# Altium footprint library FOOTPRINT.PcbLib: 132 footprints (part 5 of 9)
Each footprint in its own frame and in the unit in brackets; x right, y up, seen from the top. Pads: shape width x height; smd on the part's side, far side on the other; paste and mask are expansions set on the pad; w line width, h text height; cw(c..) or ccw(c..) is an arc to the next point about the centre after c.
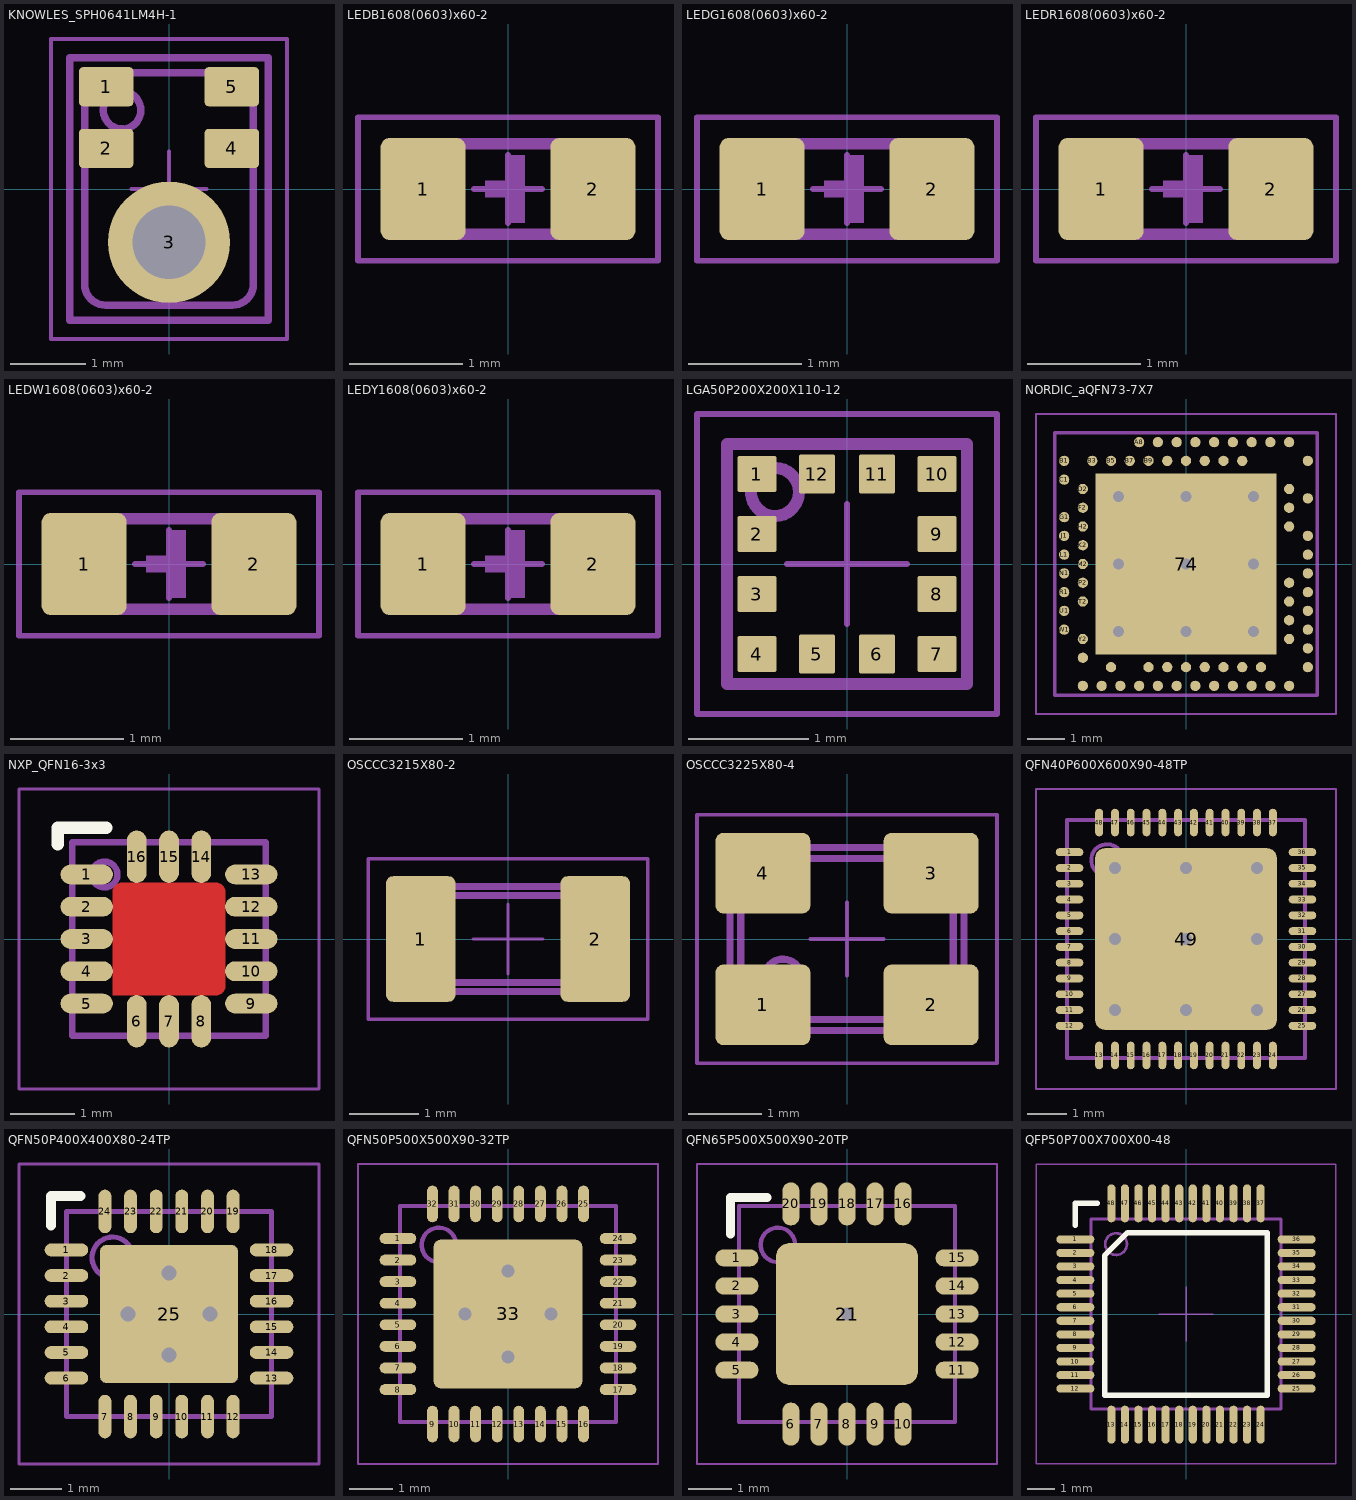
[diagram p4: the footprints below, top view; thin cyan lines are the x and y axes]

## KNOWLES_SPH0641LM4H-1 [mm] "Acoustic MEMS Microphone, 5-Pin, Body 3.5x2.65mm"
height 0.98
pads (5):
  rrect20% 0.725x0.522 smd paste-0.064: 1(-0.837,1.364) 2(-0.837,0.542) 4(0.837,0.542) 5(0.837,1.364)
  round 1.625 hole 0.975 paste-10: 3(0,-0.71)
Top Paste:
  region: -0.37,-1.236 -0.445,-1.311 -0.454,-1.32 -0.462,-1.343 -0.46,-1.368 -0.447,-1.389 -0.436,-1.396 -0.339,-1.457 -0.118,-1.522 0.112,-1.523 0.333,-1.46 0.431,-1.399 0.442,-1.392 0.457,-1.369 0.46,-1.342 0.451,-1.316 0.441,-1.307 0.371,-1.237 0.36,-1.226 0.332,-1.212 0.302,-1.207 0.271,-1.212 0.257,-1.22 0.195,-1.245 0.065,-1.275 -0.069,-1.274 -0.199,-1.244 -0.261,-1.218 -0.275,-1.211 -0.304,-1.207 -0.333,-1.212 -0.36,-1.225
  region: -0.526,-0.34 -0.601,-0.265 -0.61,-0.256 -0.633,-0.248 -0.658,-0.25 -0.679,-0.263 -0.686,-0.274 -0.747,-0.371 -0.812,-0.592 -0.813,-0.822 -0.75,-1.043 -0.689,-1.141 -0.682,-1.152 -0.659,-1.167 -0.632,-1.17 -0.606,-1.161 -0.597,-1.151 -0.527,-1.081 -0.516,-1.07 -0.502,-1.042 -0.497,-1.012 -0.502,-0.981 -0.51,-0.967 -0.535,-0.905 -0.565,-0.775 -0.564,-0.641 -0.534,-0.511 -0.508,-0.449 -0.501,-0.435 -0.497,-0.406 -0.502,-0.377 -0.515,-0.35
  region: 0.37,-0.184 0.445,-0.109 0.454,-0.1 0.462,-0.077 0.46,-0.052 0.447,-0.031 0.436,-0.024 0.339,0.037 0.118,0.102 -0.112,0.103 -0.333,0.04 -0.431,-0.021 -0.442,-0.028 -0.457,-0.051 -0.46,-0.078 -0.451,-0.104 -0.441,-0.113 -0.371,-0.183 -0.36,-0.194 -0.332,-0.208 -0.302,-0.213 -0.271,-0.208 -0.257,-0.2 -0.195,-0.175 -0.065,-0.145 0.069,-0.146 0.199,-0.176 0.261,-0.202 0.275,-0.209 0.304,-0.213 0.333,-0.208 0.36,-0.195
  region: 0.526,-1.08 0.601,-1.155 0.61,-1.164 0.633,-1.172 0.658,-1.17 0.679,-1.157 0.686,-1.146 0.747,-1.049 0.812,-0.828 0.813,-0.598 0.75,-0.377 0.689,-0.279 0.682,-0.268 0.659,-0.253 0.632,-0.25 0.606,-0.259 0.597,-0.269 0.527,-0.339 0.516,-0.35 0.502,-0.378 0.497,-0.408 0.502,-0.439 0.51,-0.453 0.535,-0.515 0.565,-0.645 0.564,-0.779 0.534,-0.909 0.508,-0.971 0.501,-0.985 0.497,-1.014 0.502,-1.043 0.515,-1.07
Top Assembly:
  circle w0.1: c-0.625,1.05 r0.25
  lines w0.1: -1.325,-1.75 1.325,-1.75 1.325,1.75 -1.325,1.75 -1.325,-1.75 ; -1.125,-1.271 ccw(c-0.846,-1.271) -0.846,-1.55 0.846,-1.55 ccw(c0.846,-1.271) 1.125,-1.271 1.125,1.271 ccw(c0.846,1.271) 0.846,1.55 -0.846,1.55 ccw(c-0.846,1.271) -1.125,1.271 -1.125,-1.271
Top Courtyard:
  lines w0.05: -1.575,-2 -1.325,-2 1.575,-2 1.575,2 -1.575,2 -1.575,-2
Top Component Center:
  lines w0.05: -0.5,0 0.5,0 ; 0,-0.5 0,0.5
Top Designator:
  text "'.Comment'" at 0.357,-1.475 h0.65
  text "'.Designator'" at -0.404,-1.475 h0.65
3D body "KNOWLES_SPH0641LM4H-1.x_t": height 0.99, standoff 0.01, extent -1.325,-1.75 1.325,1.75

## LEDB1608(0603)x60-2 [mm] "Led Blue, 2-Leads, Body 1.60x0.80mm"
height 0.6
pads (2):
  rrect20% 0.75x0.9 smd: 1(-0.75,0) 2(0.75,0)
Top Assembly:
  region: -0.2,0.075 -0.2,-0.075 0,-0.075 0,-0.3 0.15,-0.3 0.15,0.3 0,0.3 0,0.075
  lines w0.1: 0.8,-0.4 -0.8,-0.4 -0.8,0.4 0.8,0.4 ; 0.802,-0.4 0.802,0.4
  text "A" at 0.25,-0.207 h0.65
  text "C" at -0.65,-0.207 h0.65
Top Courtyard:
  lines w0.05: -1.325,-0.635 -1.325,0.635 1.325,0.635 1.325,-0.635 -1.325,-0.635
Top Component Center:
  lines w0.05: -0.3,0 0.3,0 ; 0,-0.3 0,0.3
Top Designator:
  text "'.Designator'" at 0.975,0.026 h0.65
  text "'.Comment'" at 0.975,-0.507 h0.65
3D body "User Library-LED_0603_B.x_t": height 0.6, standoff 0, extent -0.8,-0.4 0.8,0.4

## LEDG1608(0603)x60-2 [mm] "Led Green, 2-Leads, Body 1.60x0.80mm"
height 0.6
pads (2):
  rrect20% 0.75x0.9 smd: 1(-0.75,0) 2(0.75,0)
Top Assembly:
  region: -0.2,0.075 -0.2,-0.075 0,-0.075 0,-0.3 0.15,-0.3 0.15,0.3 0,0.3 0,0.075
  lines w0.1: 0.8,-0.4 -0.8,-0.4 -0.8,0.4 0.8,0.4 ; 0.802,-0.4 0.802,0.4
  text "A" at 0.25,-0.207 h0.65
  text "C" at -0.65,-0.207 h0.65
Top Courtyard:
  lines w0.05: -1.325,-0.635 1.325,-0.635 1.325,0.635 -1.325,0.635 -1.325,-0.635
Top Component Center:
  lines w0.05: -0.3,0 0.3,0 ; 0,-0.3 0,0.3
Top Designator:
  text "'.Designator'" at 0.975,0.026 h0.65
  text "'.Comment'" at 0.975,-0.507 h0.65
3D body "User Library-LED_0603_G.x_t": height 0.6, standoff 0, extent -0.8,-0.4 0.8,0.4

## LEDR1608(0603)x60-2 [mm] "Led Red, 2-Leads, Body 1.60x0.80mm"
height 0.6
pads (2):
  rrect20% 0.75x0.9 smd: 1(-0.75,0) 2(0.75,0)
Top Assembly:
  region: -0.2,0.075 -0.2,-0.075 0,-0.075 0,-0.3 0.15,-0.3 0.15,0.3 0,0.3 0,0.075
  lines w0.1: 0.8,-0.4 -0.8,-0.4 -0.8,0.4 0.8,0.4 ; 0.802,-0.4 0.802,0.4
  text "C" at -0.65,-0.207 h0.65
  text "A" at 0.25,-0.207 h0.65
Top Courtyard:
  lines w0.05: -1.325,-0.635 1.325,-0.635 1.325,0.635 -1.325,0.635 -1.325,-0.635
Top Component Center:
  lines w0.05: -0.3,0 0.3,0 ; 0,-0.3 0,0.3
Top Designator:
  text "'.Designator'" at 0.975,0.026 h0.65
  text "'.Comment'" at 0.975,-0.507 h0.65
3D body "User Library-LED_0603_R.x_t": height 0.6, standoff 0, extent -0.8,-0.4 0.8,0.4

## LEDW1608(0603)x60-2 [mm] "Led White, 2-Leads, Body 1.60x0.80mm"
height 0.6
pads (2):
  rrect20% 0.75x0.9 smd: 1(-0.75,0) 2(0.75,0)
Top Assembly:
  region: -0.2,0.075 -0.2,-0.075 0,-0.075 0,-0.3 0.15,-0.3 0.15,0.3 0,0.3 0,0.075
  lines w0.1: 0.8,-0.4 -0.8,-0.4 -0.8,0.4 0.8,0.4 ; 0.802,-0.4 0.802,0.4
  text "A" at 0.25,-0.207 h0.65
  text "C" at -0.65,-0.207 h0.65
Top Courtyard:
  lines w0.05: -1.325,-0.635 -1.325,0.635 1.325,0.635 1.325,-0.635 -1.325,-0.635
Top Component Center:
  lines w0.05: -0.3,0 0.3,0 ; 0,-0.3 0,0.3
Top Designator:
  text "'.Comment'" at 0.975,-0.507 h0.65
  text "'.Designator'" at 0.975,0.026 h0.65
3D body "User Library-LED_0603_W.x_t": height 0.6, standoff 0, extent -0.8,-0.4 0.8,0.4

## LEDY1608(0603)x60-2 [mm] "Led Yellow, 2-Leads, Body 1.60x0.80mm"
height 0.6
pads (2):
  rrect20% 0.75x0.9 smd: 1(-0.75,0) 2(0.75,0)
Top Assembly:
  region: -0.2,0.075 -0.2,-0.075 0,-0.075 0,-0.3 0.15,-0.3 0.15,0.3 0,0.3 0,0.075
  lines w0.1: 0.8,-0.4 -0.8,-0.4 -0.8,0.4 0.8,0.4 ; 0.802,-0.4 0.802,0.4
  text "C" at -0.65,-0.207 h0.65
  text "A" at 0.25,-0.207 h0.65
Top Courtyard:
  lines w0.05: -1.325,-0.635 1.325,-0.635 1.325,0.635 -1.325,0.635 -1.325,-0.635
Top Component Center:
  lines w0.05: -0.3,0 0.3,0 ; 0,-0.3 0,0.3
Top Designator:
  text "'.Designator'" at 0.975,0.026 h0.65
  text "'.Comment'" at 0.975,-0.507 h0.65
3D body "User Library-LED_0603_Y.x_t": height 0.6, standoff 0, extent -0.8,-0.4 0.8,0.4

## LGA50P200X200X110-12 [mm] "LGA12, 12-Leads, Body 2.00x2.00mm"
height 1.1
pads (12):
  rrect10% 0.325x0.3 smd paste-0.008: 1(-0.75,0.75) 2(-0.75,0.25) 3(-0.75,-0.25) 4(-0.75,-0.75) 7(0.75,-0.75) 8(0.75,-0.25) 9(0.75,0.25) 10(0.75,0.75)
  rrect10% 0.3x0.325 smd paste-0.008: 5(-0.25,-0.75) 6(0.25,-0.75) 11(0.25,0.75) 12(-0.25,0.75)
Top Assembly:
  circle w0.1: c-0.6,0.6 r0.2
  lines w0.1: -1,-1 -1,1 1,1 1,-1 -1,-1
Top Courtyard:
  lines w0.05: -1.25,-1.25 1.25,-1.25 1.25,1.25 -1.25,1.25 -1.25,-1.25
Top Component Center:
  lines w0.05: -0.5,0 0.5,0 ; 0,-0.5 0,0.5
Top Designator:
  text "'.Designator'" at -1.25,-1.496 h0.65
  text "'.Comment'" at -1.25,-1.982 h0.65
3D body: height 1.1, standoff 0, extent -1,-1 1,1
3D body: height 1.1, standoff 0, extent -0.75,0.3 -0.3,0.75

## NORDIC_aQFN73-7X7 [mm] "QFN73, 73-Leads, Thermal Pad, Body 7.00x7.00mm"
pads (74):
  rect 4.83x4.83 smd paste-100 mask+0.05: 74(0,0)
  round 0.275 smd paste-0.01 mask+0.05: A8(-1.25,3.25) A10(-0.75,3.25) A12(-0.25,3.25) A14(0.25,3.25) A16(0.75,3.25) A18(1.25,3.25) A20(1.75,3.25) A22(2.25,3.25) A23(2.75,3.25) AA24(3.25,-2.25) AB2(-2.75,-2.5) AC5(-2,-2.75) AC9(-1,-2.75) AC11(-0.5,-2.75) AC13(0,-2.75) AC15(0.5,-2.75) AC17(1,-2.75) AC19(1.5,-2.75) AC21(2,-2.75) AC24(3.25,-2.75) AD2(-2.75,-3.25) AD4(-2.25,-3.25) AD6(-1.75,-3.25) AD8(-1.25,-3.25) AD10(-0.75,-3.25) AD12(-0.25,-3.25) AD14(0.25,-3.25) AD16(0.75,-3.25) AD18(1.25,-3.25) AD20(1.75,-3.25) AD22(2.25,-3.25) AD23(2.75,-3.25) B1(-3.25,2.75) B3(-2.5,2.75) B5(-2,2.75) B7(-1.5,2.75) B9(-1,2.75) B11(-0.5,2.75) B13(0,2.75) B15(0.5,2.75) B17(1,2.75) B19(1.5,2.75) B24(3.25,2.75) C1(-3.25,2.25) D2(-2.75,2) D23(2.75,2) E24(3.25,1.75) F2(-2.75,1.5) F23(2.75,1.5) G1(-3.25,1.25) H2(-2.75,1) H23(2.75,1) J1(-3.25,0.75) J24(3.25,0.75) K2(-2.75,0.5) L1(-3.25,0.25) L24(3.25,0.25) M2(-2.75,0) N1(-3.25,-0.25) N24(3.25,-0.25) P2(-2.75,-0.5) P23(2.75,-0.5) R1(-3.25,-0.75) R24(3.25,-0.75) T2(-2.75,-1) T23(2.75,-1) U1(-3.25,-1.25) U24(3.25,-1.25) V23(2.75,-1.5) W1(-3.25,-1.75) W24(3.25,-1.75) Y2(-2.75,-2) Y23(2.75,-2)
via -1.8,0 diameter 0.6 hole 0.3
via -1.8,-1.8 diameter 0.6 hole 0.3
via 1.8,-1.8 diameter 0.6 hole 0.3
via -1.8,1.8 diameter 0.6 hole 0.3
via 1.8,1.8 diameter 0.6 hole 0.3
via 1.8,0 diameter 0.6 hole 0.3
via 0,1.8 diameter 0.6 hole 0.3
via 0,-1.8 diameter 0.6 hole 0.3
via 0,0 diameter 0.6 hole 0.3
Top Paste:
  drawing of 16 lines, arcs and shapes, not listed
Top Assembly:
  lines w0.1: -3.5,-3.5 -3.5,3.5 3.5,3.5 3.5,-3.5 -3.5,-3.5
Top Courtyard:
  lines w0.05: -4,-4 4,-4 4,4 -4,4 -4,-4
Top Component Center:
  lines w0.05: -1,0 1,0 ; 0,-1 0,1
Top Designator:
  text "'.Designator'" at -1.75,0.426 h0.65
  text "'.Comment'" at -1.75,-0.735 h0.65
3D body: height 0.85, standoff 0, extent -3.5,-3.5 3.5,3.5
3D body: height 0.05, standoff 0, extent -3.1,2.7 -2.7,3.1
3D body: height 0.84, standoff 0.05, extent -3.1,2.7 -2.7,3.1

## NXP_QFN16-3x3 [mm] "QFN16, 16-Leads, Body 3.00x3.00mm"
height 1
pads (16):
  oval 0.813x0.305 smd paste+0: 1(-1.275,1) 2(-1.275,0.5) 3(-1.275,0) 4(-1.275,-0.5) 5(-1.275,-1) 9(1.275,-1) 10(1.275,-0.5) 11(1.275,0) 12(1.275,0.5) 13(1.275,1)
  oval 0.305x0.813 smd paste+0: 6(-0.5,-1.275) 7(0,-1.275) 8(0.5,-1.275) 14(0.5,1.275) 15(0,1.275) 16(-0.5,1.275)
Top:
  pour cut-out: -0.875,-0.875 -0.875,0.725 -0.875,0.755 -0.852,0.81 -0.81,0.852 -0.755,0.875 -0.725,0.875 0.725,0.875 0.755,0.875 0.81,0.852 0.852,0.81 0.875,0.755 0.875,0.725 0.875,-0.725 0.875,-0.755 0.852,-0.81 0.81,-0.852 0.755,-0.875 0.725,-0.875
Top Overlay:
  lines w0.2: -1.725,1.475 -1.725,1.725 -0.975,1.725
Top Assembly:
  circle w0.1: c-1,1 r0.2
  lines w0.1: -1.5,-1.5 -1.5,1.5 1.5,1.5 1.5,-1.5 -1.5,-1.5
Top Courtyard:
  lines w0.05: -2.325,-2.325 2.325,-2.325 2.325,2.325 -2.325,2.325 -2.325,-2.325
Top Component Center:
  lines w0.05: -0.5,0 0.5,0 ; 0,-0.5 0,0.5
Top Designator:
  text "'.Designator'" at -1.425,0.254 h0.65
  text "'.Comment'" at -1.425,-0.557 h0.65
3D body "QFN_QFN50P300X300X100-16.x_t": height 1.01, standoff 0.01, extent -1.51,-1.51 1.51,1.51

## OSCCC3215X80-2 [mm] "Oscillator, Corner Concave, 2-Leads, Body 3.20x1.50mm"
height 0.8
pads (2):
  rrect20% 1x1.8 smd: 1(-1.25,0) 2(1.25,0)
Top Assembly:
  lines w0.1: 1.4,-0.75 -1.4,-0.75 ccw(c-1.6,-0.75) -1.6,-0.55 -1.6,0.55 ; 1.4,-0.75 cw(c1.6,-0.75) 1.6,-0.55 1.6,0.55 ; -1.6,0.55 ccw(c-1.6,0.75) -1.4,0.75 1.4,0.75 ccw(c1.6,0.75) 1.6,0.55 ; -1.6,0.55 -1.6,0.55 ; 1.6,0.55 1.6,0.55 ; -1.45,-0.325 ccw(c-1.15,-0.325) -1.15,-0.625 1.15,-0.625 ccw(c1.15,-0.325) 1.45,-0.325 1.45,0.325 ccw(c1.15,0.325) 1.15,0.625 -1.15,0.625 ccw(c-1.15,0.325) -1.45,0.325 -1.45,-0.325
Top Courtyard:
  lines w0.05: -2,-1.15 -2,1.15 2,1.15 2,-1.15 -2,-1.15
Top Component Center:
  lines w0.05: -0.5,0 0.5,0 ; 0,-0.5 0,0.5
Top Designator:
  text "'.Designator'" at -1.375,0.076 h0.65
  text "'.Comment'" at -1.375,-0.51 h0.65
3D body "OSCCC3215X80-2.x_t": height 0.81, standoff 0.01, extent -1.6,-0.75 1.6,0.75

## OSCCC3225X80-4 [mm] "Oscillator, Corner Concave, 4-Leads, Body 3.20x2.50mm"
height 0.8
pads (4):
  rrect20% 1.3x1.1 smd: 1(-1.15,-0.9) 2(1.15,-0.9) 3(1.15,0.9) 4(-1.15,0.9)
Top Assembly:
  circle w0.1: c-0.875,-0.525 r0.25
  lines w0.1: -1.6,-1.05 cw(c-1.6,-1.25) -1.4,-1.25 1.4,-1.25 cw(c1.6,-1.25) 1.6,-1.05 1.6,1.05 cw(c1.6,1.25) 1.4,1.25 -1.4,1.25 cw(c-1.6,1.25) -1.6,1.05 -1.6,-1.05 ; -1.45,-0.8 ccw(c-1.15,-0.8) -1.15,-1.1 1.15,-1.1 ccw(c1.15,-0.8) 1.45,-0.8 1.45,0.8 ccw(c1.15,0.8) 1.15,1.1 -1.15,1.1 ccw(c-1.15,0.8) -1.45,0.8 -1.45,-0.8
Top Courtyard:
  lines w0.05: -2.05,-1.7 2.05,-1.7 2.05,1.7 -2.05,1.7 -2.05,-1.7
Top Component Center:
  lines w0.05: -0.5,0 0.5,0 ; 0,-0.5 0,0.5
Top Designator:
  text "'.Designator'" at -1.375,0.076 h0.65
  text "'.Comment'" at -1.375,-0.51 h0.65
3D body "OSCCC3225X80.x_t": height 0.81, standoff 0.01, extent -1.6,-1.25 1.6,1.25

## QFN40P600X600X90-48TP [mm] "QFN48, 49-Leads, Thermal Pad, Body 6.00x6.00mm"
height 0.9
pads (49):
  oval 0.7x0.2 smd paste+0: 1(-2.95,2.2) 2(-2.95,1.8) 3(-2.95,1.4) 4(-2.95,1) 5(-2.95,0.6) 6(-2.95,0.2) 7(-2.95,-0.2) 8(-2.95,-0.6) 9(-2.95,-1) 10(-2.95,-1.4) 11(-2.95,-1.8) 12(-2.95,-2.2) 25(2.95,-2.2) 26(2.95,-1.8) 27(2.95,-1.4) 28(2.95,-1) 29(2.95,-0.6) 30(2.95,-0.2) 31(2.95,0.2) 32(2.95,0.6) 33(2.95,1) 34(2.95,1.4) 35(2.95,1.8) 36(2.95,2.2)
  oval 0.2x0.7 smd paste+0: 13(-2.2,-2.95) 14(-1.8,-2.95) 15(-1.4,-2.95) 16(-1,-2.95) 17(-0.6,-2.95) 18(-0.2,-2.95) 19(0.2,-2.95) 20(0.6,-2.95) 21(1,-2.95) 22(1.4,-2.95) 23(1.8,-2.95) 24(2.2,-2.95) 37(2.2,2.95) 38(1.8,2.95) 39(1.4,2.95) 40(1,2.95) 41(0.6,2.95) 42(0.2,2.95) 43(-0.2,2.95) 44(-0.6,2.95) 45(-1,2.95) 46(-1.4,2.95) 47(-1.8,2.95) 48(-2.2,2.95)
  rrect10% 4.6x4.6 smd paste-100: 49(0,0)
via 0,0 diameter 0.6 hole 0.3
via 0,-1.8 diameter 0.6 hole 0.3
via 0,1.8 diameter 0.6 hole 0.3
via 1.8,0 diameter 0.6 hole 0.3
via 1.8,1.8 diameter 0.6 hole 0.3
via -1.8,1.8 diameter 0.6 hole 0.3
via 1.8,-1.8 diameter 0.6 hole 0.3
via -1.8,-1.8 diameter 0.6 hole 0.3
via -1.8,0 diameter 0.6 hole 0.3
Top Paste:
  drawing of 14 lines, arcs and shapes, not listed
Top Assembly:
  circle w0.1: c-2,2 r0.4
  lines w0.1: -3.01,-3.01 -3.01,3.01 3.01,3.01 3.01,-3.01 -3.01,-3.01
Top Courtyard:
  lines w0.05: -3.8,-3.8 3.8,-3.8 3.8,3.8 -3.8,3.8 -3.8,-3.8
Top Component Center:
  lines w0.05: -1,0 1,0 ; 0,-1 0,1
Top Designator:
  text "'.Designator'" at -1.925,0.351 h0.65
  text "'.Comment'" at -1.925,-0.81 h0.65
3D body "QFN_QFN40P600X600X90-48P.x_t": height 0.91, standoff 0.01, extent -3.01,-3.01 3.01,3.01

## QFN50P400X400X80-24TP [mm] "QFN24, 25-Leads, Thermal Pad, Body 4.00x4.00mm"
height 0.9
pads (25):
  oval 0.85x0.25 smd paste-0.02: 1(-2,1.25) 2(-2,0.75) 3(-2,0.25) 4(-2,-0.25) 5(-2,-0.75) 6(-2,-1.25) 13(2,-1.25) 14(2,-0.75) 15(2,-0.25) 16(2,0.25) 17(2,0.75) 18(2,1.25)
  oval 0.25x0.85 smd paste-0.02: 7(-1.25,-2) 8(-0.75,-2) 9(-0.25,-2) 10(0.25,-2) 11(0.75,-2) 12(1.25,-2) 19(1.25,2) 20(0.75,2) 21(0.25,2) 22(-0.25,2) 23(-0.75,2) 24(-1.25,2)
  rrect10% 2.7x2.7 smd paste-100: 25(0,0)
via 0,0.8 diameter 0.6 hole 0.3
via -0.8,0 diameter 0.6 hole 0.3
via 0.8,0 diameter 0.6 hole 0.3
via 0,-0.8 diameter 0.6 hole 0.3
Top Overlay:
  lines w0.2: -2.3,1.725 -2.3,2.3 -1.725,2.3
Top Paste:
  region: 0.3,-0.8 0.3,-0.899 0.376,-1.083 0.517,-1.224 0.701,-1.3 0.8,-1.3 0.899,-1.3 1.083,-1.224 1.224,-1.083 1.3,-0.899 1.3,-0.8 1.3,-0.701 1.224,-0.517 1.083,-0.376 0.899,-0.3 0.8,-0.3 0.701,-0.3 0.517,-0.376 0.376,-0.517 0.3,-0.701
  region: -0.8,-0.3 -0.899,-0.3 -1.083,-0.376 -1.224,-0.517 -1.3,-0.701 -1.3,-0.8 -1.3,-0.899 -1.224,-1.083 -1.083,-1.224 -0.899,-1.3 -0.8,-1.3 -0.701,-1.3 -0.517,-1.224 -0.376,-1.083 -0.3,-0.899 -0.3,-0.8 -0.3,-0.701 -0.376,-0.517 -0.517,-0.376 -0.701,-0.3
  region: -0.3,0.8 -0.3,0.899 -0.376,1.083 -0.517,1.224 -0.701,1.3 -0.8,1.3 -0.899,1.3 -1.083,1.224 -1.224,1.083 -1.3,0.899 -1.3,0.8 -1.3,0.701 -1.224,0.517 -1.083,0.376 -0.899,0.3 -0.8,0.3 -0.701,0.3 -0.517,0.376 -0.376,0.517 -0.3,0.701
  region: 0.8,0.3 0.899,0.3 1.083,0.376 1.224,0.517 1.3,0.701 1.3,0.8 1.3,0.899 1.224,1.083 1.083,1.224 0.899,1.3 0.8,1.3 0.701,1.3 0.517,1.224 0.376,1.083 0.3,0.899 0.3,0.8 0.3,0.701 0.376,0.517 0.517,0.376 0.701,0.3
  region: 0,-0.5 0.099,-0.5 0.283,-0.424 0.424,-0.283 0.5,-0.099 0.5,0 0.5,0.099 0.424,0.283 0.283,0.424 0.099,0.5 0,0.5 -0.099,0.5 -0.283,0.424 -0.424,0.283 -0.5,0.099 -0.5,0 -0.5,-0.099 -0.424,-0.283 -0.283,-0.424 -0.099,-0.5
Top Assembly:
  circle w0.1: c-1.1,1.1 r0.4
  lines w0.1: -2,-2 2,-2 2,2 -2,2 -2,-2
Top Courtyard:
  lines w0.05: -2.925,-2.925 2.925,-2.925 2.925,2.925 -2.925,2.925 -2.925,-2.425 -2.925,-2.925
Top Component Center:
  lines w0.05: -1,0 1,0 ; 0,-1 0,1
Top Designator:
  text "'.Comment'" at -1.475,-0.81 h0.65
  text "'.Designator'" at -1.475,0.351 h0.65
3D body "QFN_QFN50P400X400X80-24TP.x_t": height 0.91, standoff 0.01, extent -2.01,-2.01 2.01,2.01

## QFN50P500X500X90-32TP [mm] "QFN48, 33-Leads, Thermal Pad, Body 5.00x5.00mm"
height 0.9
pads (33):
  oval 0.85x0.25 smd: 1(-2.55,1.75) 2(-2.55,1.25) 3(-2.55,0.75) 4(-2.55,0.25) 5(-2.55,-0.25) 6(-2.55,-0.75) 7(-2.55,-1.25) 8(-2.55,-1.75) 17(2.55,-1.75) 18(2.55,-1.25) 19(2.55,-0.75) 20(2.55,-0.25) 21(2.55,0.25) 22(2.55,0.75) 23(2.55,1.25) 24(2.55,1.75)
  oval 0.25x0.85 smd: 9(-1.75,-2.55) 10(-1.25,-2.55) 11(-0.75,-2.55) 12(-0.25,-2.55) 13(0.25,-2.55) 14(0.75,-2.55) 15(1.25,-2.55) 16(1.75,-2.55) 25(1.75,2.55) 26(1.25,2.55) 27(0.75,2.55) 28(0.25,2.55) 29(-0.25,2.55) 30(-0.75,2.55) 31(-1.25,2.55) 32(-1.75,2.55)
  rrect10% 3.45x3.45 smd paste-100: 33(0,0)
via -1,0 diameter 0.6 hole 0.3
via 0,-1 diameter 0.6 hole 0.3
via 1,0 diameter 0.6 hole 0.3
via 0,1 diameter 0.6 hole 0.3
Top Paste:
  region: 1.575,-1 1.575,-1.114 1.487,-1.326 1.326,-1.487 1.114,-1.575 1,-1.575 0.886,-1.575 0.674,-1.487 0.513,-1.326 0.425,-1.114 0.425,-1 0.425,-0.886 0.513,-0.674 0.674,-0.513 0.886,-0.425 1,-0.425 1.114,-0.425 1.326,-0.513 1.487,-0.674 1.575,-0.886
  region: 1,1.575 1.115,1.575 1.326,1.487 1.488,1.326 1.575,1.114 1.575,1 1.575,0.886 1.488,0.674 1.326,0.513 1.115,0.425 1,0.425 0.886,0.425 0.674,0.513 0.513,0.674 0.425,0.886 0.425,1 0.425,1.114 0.513,1.326 0.674,1.487 0.886,1.575
  region: -1.575,1 -1.575,1.115 -1.487,1.326 -1.326,1.488 -1.114,1.575 -1,1.575 -0.885,1.575 -0.674,1.488 -0.512,1.326 -0.425,1.115 -0.425,1 -0.425,0.886 -0.512,0.674 -0.674,0.513 -0.885,0.425 -1,0.425 -1.114,0.425 -1.326,0.513 -1.487,0.674 -1.575,0.886
  region: -1,-1.575 -1.114,-1.575 -1.326,-1.487 -1.487,-1.326 -1.575,-1.114 -1.575,-1 -1.575,-0.885 -1.487,-0.674 -1.326,-0.512 -1.114,-0.425 -1,-0.425 -0.886,-0.425 -0.674,-0.512 -0.513,-0.674 -0.425,-0.885 -0.425,-1 -0.425,-1.114 -0.513,-1.326 -0.674,-1.487 -0.886,-1.575
  region: 0.575,0 0.575,-0.114 0.487,-0.326 0.326,-0.487 0.114,-0.575 0,-0.575 -0.114,-0.575 -0.326,-0.487 -0.487,-0.326 -0.575,-0.114 -0.575,0 -0.575,0.114 -0.487,0.326 -0.326,0.487 -0.114,0.575 0,0.575 0.114,0.575 0.326,0.487 0.487,0.326 0.575,0.114
Top Assembly:
  circle w0.1: c-1.6,1.6 r0.4
  lines w0.1: -2.5,-2.5 2.5,-2.5 2.5,2.5 -2.5,2.5 -2.5,-2.5
Top Courtyard:
  lines w0.05: -3.475,-3.475 3.475,-3.475 3.475,3.475 -3.475,3.475 -3.475,-3.475
Top Component Center:
  lines w0.05: -1,0 1,0 ; 0,-1 0,1
Top Designator:
  text "'.Designator'" at -1.925,0.351 h0.65
  text "'.Comment'" at -1.925,-0.81 h0.65
3D body "QFN_QFN50P500X500X90-32TP.x_t": height 1.01, standoff 0.01, extent -2.51,-2.51 2.51,2.51

## QFN65P500X500X90-20TP [mm] "QFN20, 21-Leads, Thermal Pad, Body 5.00x5.00mm"
height 0.9
pads (21):
  oval 1x0.4 smd: 1(-2.55,1.3) 2(-2.55,0.65) 3(-2.55,0) 4(-2.55,-0.65) 5(-2.55,-1.3) 11(2.55,-1.3) 12(2.55,-0.65) 13(2.55,0) 14(2.55,0.65) 15(2.55,1.3)
  oval 0.4x1 smd: 6(-1.3,-2.55) 7(-0.65,-2.55) 8(0,-2.55) 9(0.65,-2.55) 10(1.3,-2.55) 16(1.3,2.55) 17(0.65,2.55) 18(0,2.55) 19(-0.65,2.55) 20(-1.3,2.55)
  rrect20% 3.3x3.3 smd paste-10: 21(0,0)
via 0,0 diameter 0.6 hole 0.3
Top Overlay:
  lines w0.2: -2.7,1.85 -2.7,2.7 -1.85,2.7
Top Paste:
  region: 0.625,-0.525 1.225,-0.525 1.245,-0.525 1.282,-0.54 1.31,-0.568 1.325,-0.605 1.325,-0.625 1.325,-1.225 1.325,-1.245 1.31,-1.282 1.282,-1.31 1.245,-1.325 1.225,-1.325 0.625,-1.325 0.605,-1.325 0.568,-1.31 0.54,-1.282 0.525,-1.245 0.525,-1.225 0.525,-0.625 0.525,-0.605 0.54,-0.568 0.568,-0.54 0.605,-0.525
  region: 0.525,0.625 0.525,1.225 0.525,1.245 0.54,1.282 0.568,1.31 0.605,1.325 0.625,1.325 1.225,1.325 1.245,1.325 1.282,1.31 1.31,1.282 1.325,1.245 1.325,1.225 1.325,0.625 1.325,0.605 1.31,0.568 1.282,0.54 1.245,0.525 1.225,0.525 0.625,0.525 0.605,0.525 0.568,0.54 0.54,0.568 0.525,0.605
  region: -0.625,0.525 -1.225,0.525 -1.245,0.525 -1.282,0.54 -1.31,0.568 -1.325,0.605 -1.325,0.625 -1.325,1.225 -1.325,1.245 -1.31,1.282 -1.282,1.31 -1.245,1.325 -1.225,1.325 -0.625,1.325 -0.605,1.325 -0.568,1.31 -0.54,1.282 -0.525,1.245 -0.525,1.225 -0.525,0.625 -0.525,0.605 -0.54,0.568 -0.568,0.54 -0.605,0.525
  region: -0.525,-0.625 -0.525,-1.225 -0.525,-1.245 -0.54,-1.282 -0.568,-1.31 -0.605,-1.325 -0.625,-1.325 -1.225,-1.325 -1.245,-1.325 -1.282,-1.31 -1.31,-1.282 -1.325,-1.245 -1.325,-1.225 -1.325,-0.625 -1.325,-0.605 -1.31,-0.568 -1.282,-0.54 -1.245,-0.525 -1.225,-0.525 -0.625,-0.525 -0.605,-0.525 -0.568,-0.54 -0.54,-0.568 -0.525,-0.605
Top Assembly:
  circle w0.1: c-1.6,1.6 r0.4
  lines w0.1: -2.5,-2.5 2.5,-2.5 2.5,2.5 -2.5,2.5 -2.5,-2.5
Top Courtyard:
  lines w0.05: -3.475,-3.475 -3.475,3.475 3.475,3.475 3.475,-3.475 -3.475,-3.475
Top Component Center:
  lines w0.05: -0.5,0 0.5,0 ; 0,-0.5 0,0.5
Top Designator:
  text "'.Comment'" at -1.825,-0.81 h0.65
  text "'.Designator'" at -1.825,0.351 h0.65
3D body "QFN_QFN65P500X500X90-20TP.x_t": height 0.91, standoff 0.01, extent -2.51,-2.51 2.51,2.51

## QFP50P700X700X00-48 [mm] "QFP48, 48-Leads, Body 7.00x7.00mm"
height 1
pads (48):
  oval 1.4x0.3 smd paste-0.025: 1(-4.075,2.75) 2(-4.075,2.25) 3(-4.075,1.75) 4(-4.075,1.25) 5(-4.075,0.75) 6(-4.075,0.25) 7(-4.075,-0.25) 8(-4.075,-0.75) 9(-4.075,-1.25) 10(-4.075,-1.75) 11(-4.075,-2.25) 12(-4.075,-2.75) 25(4.075,-2.75) 26(4.075,-2.25) 27(4.075,-1.75) 28(4.075,-1.25) 29(4.075,-0.75) 30(4.075,-0.25) 31(4.075,0.25) 32(4.075,0.75) 33(4.075,1.25) 34(4.075,1.75) 35(4.075,2.25) 36(4.075,2.75)
  oval 0.3x1.4 smd paste-0.025: 13(-2.75,-4.075) 14(-2.25,-4.075) 15(-1.75,-4.075) 16(-1.25,-4.075) 17(-0.75,-4.075) 18(-0.25,-4.075) 19(0.25,-4.075) 20(0.75,-4.075) 21(1.25,-4.075) 22(1.75,-4.075) 23(2.25,-4.075) 24(2.75,-4.075) 37(2.75,4.075) 38(2.25,4.075) 39(1.75,4.075) 40(1.25,4.075) 41(0.75,4.075) 42(0.25,4.075) 43(-0.25,4.075) 44(-0.75,4.075) 45(-1.25,4.075) 46(-1.75,4.075) 47(-2.25,4.075) 48(-2.75,4.075)
Top Overlay:
  lines w0.2: -4.075,3.275 -4.075,4.075 -3.275,4.075 ; -3,-3 -3,2.15 -2.15,3 3,3 3,-3 -3,-3
Top Assembly:
  circle w0.1: c-2.575,2.575 r0.4
  lines w0.1: -4.5,-2.75 -3.5,-2.75 ; -4.5,-2.25 -3.5,-2.25 ; -4.5,-1.75 -3.5,-1.75 ; -4.5,-1.25 -3.5,-1.25 ; -4.5,-0.75 -3.5,-0.75 ; -4.5,-0.25 -3.5,-0.25 ; -4.5,0.25 -3.5,0.25 ; -4.5,0.75 -3.5,0.75 ; -4.5,1.25 -3.5,1.25 ; -4.5,1.75 -3.5,1.75 ; -4.5,2.25 -3.5,2.25 ; -4.5,2.75 -3.5,2.75 ; -2.75,-4.5 -2.75,-3.5 ; -2.75,3.5 -2.75,4.5 ; -2.25,-4.5 -2.25,-3.5 ; -2.25,3.5 -2.25,4.5 ; -1.75,-4.5 -1.75,-3.5 ; -1.75,3.5 -1.75,4.5 ; -1.25,-4.5 -1.25,-3.5 ; -1.25,3.5 -1.25,4.5 ; -0.75,-4.5 -0.75,-3.5 ; -0.75,3.5 -0.75,4.5 ; -0.25,-4.5 -0.25,-3.5 ; -0.25,3.5 -0.25,4.5 ; 0.25,-4.5 0.25,-3.5 ; 0.25,3.5 0.25,4.5 ; 0.75,-4.5 0.75,-3.5 ; 0.75,3.5 0.75,4.5 ; 1.25,-4.5 1.25,-3.5 ; 1.25,3.5 1.25,4.5 ; 1.75,-4.5 1.75,-3.5 ; 1.75,3.5 1.75,4.5 ; 2.25,-4.5 2.25,-3.5 ; 2.25,3.5 2.25,4.5 ; 2.75,-4.5 2.75,-3.5 ; 2.75,3.5 2.75,4.5 ; 3.5,-2.75 4.5,-2.75 ; 3.5,-2.25 4.5,-2.25 ; 3.5,-1.75 4.5,-1.75 ; 3.5,-1.25 4.5,-1.25 ; 3.5,-0.75 4.5,-0.75 ; 3.5,-0.25 4.5,-0.25 ; 3.5,0.25 4.5,0.25 ; 3.5,0.75 4.5,0.75 ; 3.5,1.25 4.5,1.25 ; 3.5,1.75 4.5,1.75 ; 3.5,2.25 4.5,2.25 ; 3.5,2.75 4.5,2.75 ; -3.5,-3.5 -3.5,3.5 3.5,3.5 3.5,-3.5 -3.5,-3.5
Top Courtyard:
  lines w0.05: -5.525,-5.525 5.525,-5.525 5.525,5.525 -5.525,5.525 -5.525,-5.525
Top Component Center:
  lines w0.05: -1,0 1,0 ; 0,-1 0,1
Top Designator:
  text "'.Comment'" at -1.925,-0.81 h0.65
  text "'.Designator'" at -1.925,0.351 h0.65
3D body "TQFP-48_7x7mm_P0.5mm.step": height 1.1, standoff 0, extent -4.5,-4.5 4.5,4.5